# Altium footprint library 15-LEDs+LCD.PcbLib: 116 footprints (part 1 of 8)
Each footprint in its own frame and in the unit in brackets; x right, y up, seen from the top. Pads: shape width x height; smd on the part's side, far side on the other; paste and mask are expansions set on the pad; w line width, h text height; cw(c..) or ccw(c..) is an arc to the next point about the centre after c.
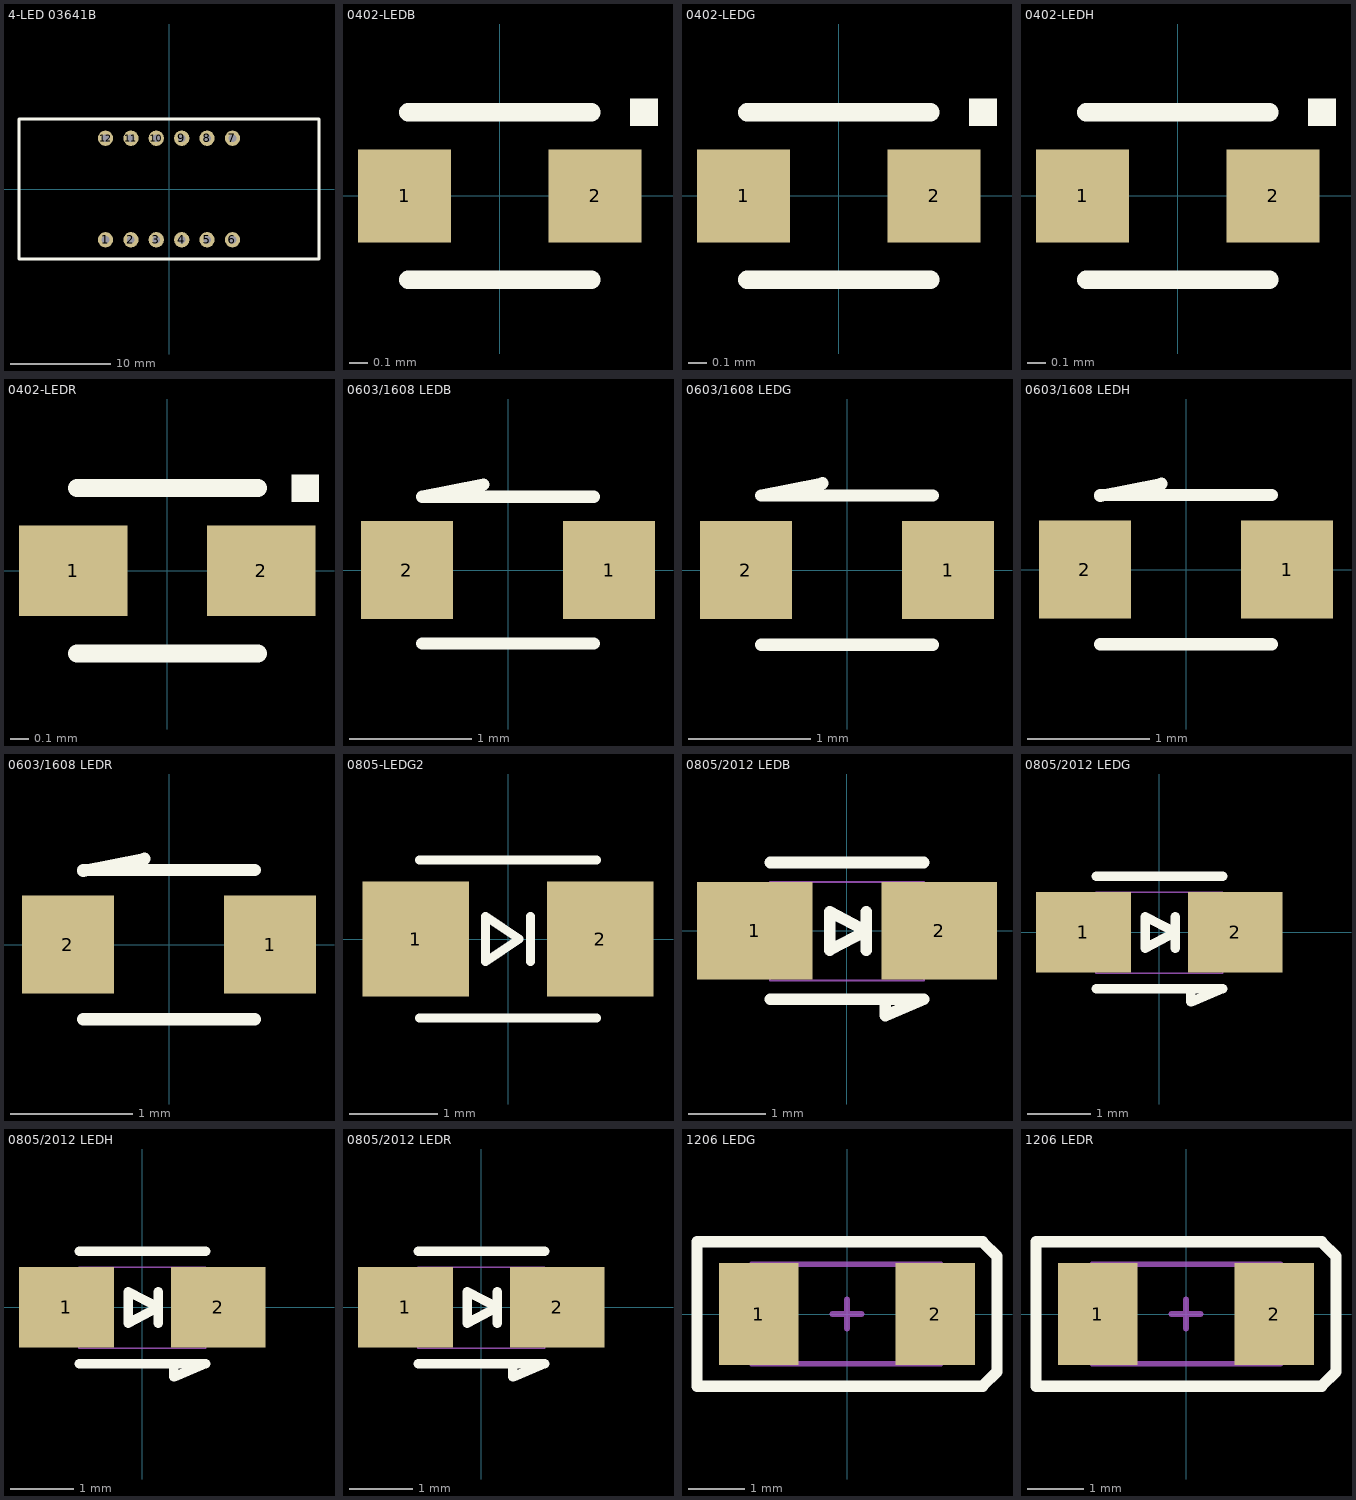
[diagram p0: the footprints below, top view; thin cyan lines are the x and y axes]

## 4-LED 03641B [mil] "CON A"
height 122.05
pads (12):
  round 60 hole 30: 1(-250,-200) 2(-150,-200) 3(-50,-200) 4(50,-200) 5(150,-200) 6(250,-200) 7(250,200) 8(150,200) 9(50,200) 10(-50,200) 11(-150,200) 12(-250,200)
Top Overlay:
  lines w10: -590.55,-275.59 590.55,-275.59 590.55,275.59 -590.55,275.59 -590.55,-275.59
Mechanical 15:
  lines w5: -589,-276 -589,276 590,276 590,-276 -589,-276
3D body "03641b.stp": height 284.25, standoff -118.11, extent -590.56,-275.6 590.54,275.58

## 0402-LEDB [mil]
height 122.05
pads (2):
  rect 20x20 smd mask+2.76: 1(-20.5,0)
  rect 20x20 smd: 2(20.5,0)
Top Overlay:
  rectangle: 28,15 34,21
  lines w3.94: -19.68,-18 19.68,-18 ; -19.68,18 19.68,18
Bottom Overlay:
3D body "0_508-0_508-0402-3.stp": height 0.79, standoff 0, extent -30.5,-10 -10.5,10
3D body "0_508-0_508-0402-3.stp": height 0.79, standoff 0, extent 10.5,-10.01 30.5,9.99
3D body "led_0402g.stp": height 15.55, standoff 0, extent -19.68,-9.84 19.68,9.84

## 0402-LEDG [mil]
height 122.05
pads (2):
  rect 20x20 smd mask+2.76: 1(-20.5,0)
  rect 20x20 smd: 2(20.5,0)
Top Overlay:
  rectangle: 28,15 34,21
  lines w3.94: -19.68,-18 19.68,-18 ; -19.68,18 19.68,18
Bottom Overlay:
3D body "led_0402b.stp": height 15.55, standoff 0, extent -19.68,-9.84 19.69,9.85
3D body "0_508-0_508-0402-3.stp": height 0.79, standoff 0, extent 10.5,-10.01 30.5,9.99
3D body "0_508-0_508-0402-3.stp": height 0.79, standoff 0, extent -30.5,-10 -10.5,10

## 0402-LEDH [mil]
height 122.05
pads (2):
  rect 20x20 smd mask+2.76: 1(-20.5,0)
  rect 20x20 smd: 2(20.5,0)
Top Overlay:
  rectangle: 28,15 34,21
  lines w3.94: -19.68,-18 19.68,-18 ; -19.68,18 19.68,18
Bottom Overlay:
3D body "led_0402h.stp": height 15.55, standoff 0, extent -19.68,-9.84 19.68,9.84
3D body "0_508-0_508-0402-3.stp": height 0.79, standoff 0, extent -30.5,-10 -10.5,10
3D body "0_508-0_508-0402-3.stp": height 0.79, standoff 0, extent 10.5,-10.01 30.5,9.99

## 0402-LEDR [mm]
height 3.1
pads (2):
  rect 0.6x0.5 smd: 1(-0.52,0)
  rect 0.6x0.5 smd mask+0.07: 2(0.52,0)
Top Overlay:
  rectangle: 0.686,0.381 0.838,0.533
  lines w0.1: -0.5,-0.457 0.5,-0.457 ; -0.5,0.457 0.5,0.457
Bottom Overlay:
3D body "0_508-0_508-0402-3.stp": height 0.02, standoff 0, extent -0.813,-0.254 -0.305,0.254
3D body "0_508-0_508-0402-3.stp": height 0.02, standoff 0, extent 0.305,-0.254 0.813,0.254
3D body "led_0402r.stp": height 0.4, standoff 0, extent -0.5,-0.25 0.5,0.25

## 0603/1608 LEDB [mm]
height 3.1
pads (2):
  rect 0.75x0.8 smd: 1(0.826,0) 2(-0.826,0)
Top Overlay:
  lines w0.1: -0.7,-0.6 0.7,-0.6 ; -0.2,0.7 -0.7,0.6 0.7,0.6
3D body "0603-ledb.stp": height 0.35, standoff 0, extent -0.8,-0.4 0.8,0.4
3D body "0_8128-0_762-0603.stp": height 0.02, standoff 0, extent -1.206,-0.406 -0.445,0.406
3D body "0_8128-0_762-0603.stp": height 0.02, standoff 0, extent 0.445,-0.406 1.206,0.406

## 0603/1608 LEDG [mm] "Kingbright,1608,LED,400 mcd 120*"
height 3.1
pads (2):
  rect 0.75x0.8 smd: 1(0.826,0) 2(-0.826,0)
Top Overlay:
  lines w0.1: -0.7,-0.61 0.7,-0.61 ; -0.2,0.71 -0.7,0.61 0.7,0.61
3D body "0603-ledg.stp": height 0.35, standoff 0, extent -0.8,-0.4 0.8,0.4
3D body "0_8128-0_762-0603.stp": height 0.02, standoff 0, extent -1.206,-0.406 -0.445,0.406
3D body "0_8128-0_762-0603.stp": height 0.02, standoff 0, extent 0.445,-0.406 1.206,0.406

## 0603/1608 LEDH [mm]
height 3.1
pads (2):
  rect 0.75x0.8 smd: 1(0.826,0) 2(-0.826,0)
Top Overlay:
  lines w0.1: -0.7,-0.61 0.7,-0.61 ; -0.7,0.6 -0.2,0.7 ; -0.7,0.61 0.7,0.61
3D body "0_8128-0_762-0603.stp": height 0.02, standoff 0, extent 0.445,-0.406 1.206,0.406
3D body "0_8128-0_762-0603.stp": height 0.02, standoff 0, extent -1.206,-0.406 -0.445,0.406
3D body "0603-led-y.stp": height 0.79, standoff 0, extent -0.8,-0.4 0.8,0.4

## 0603/1608 LEDR [mm]
height 3.1
pads (2):
  rect 0.75x0.8 smd: 1(0.826,0) 2(-0.826,0)
Top Overlay:
  lines w0.1: -0.7,-0.61 0.7,-0.61 ; -0.7,0.6 -0.2,0.7 ; -0.7,0.61 0.7,0.61
3D body "0603-led-r.stp": height 0.79, standoff 0, extent -0.8,-0.4 0.8,0.4
3D body "0_8128-0_762-0603.stp": height 0.02, standoff 0, extent -1.206,-0.406 -0.445,0.406
3D body "0_8128-0_762-0603.stp": height 0.02, standoff 0, extent 0.445,-0.406 1.206,0.406

## 0805-LEDG2 [mm]
height 3.1
pads (2):
  rect 1.2x1.3 smd: 1(-1.041,0) 2(1.041,0)
Top Overlay:
  lines w0.1: 0.254,-0.254 0.254,0.254 ; -0.254,-0.254 -0.254,0.254 0.127,0 -0.254,-0.254
  lines w0.102: -1,-0.889 1,-0.889 ; -1,0.889 1,0.889
3D body "1206-led-g.stp": height 1.39, standoff 0, extent -1.6,-0.808 1.6,0.808

## 0805/2012 LEDB [mm]
height 3.1
pads (2):
  rect 1.5x1.27 smd: 1(-1.2,0)
  rect 1.5x1.27 smd mask+0.07: 2(1.2,0)
Top Overlay:
  lines w0.15: -1,-0.889 1,-0.889 ; -1,0.889 1,0.889 ; 0.25,-0.25 0.25,0.25 ; 0.5,-1.1 1,-0.889 ; 0.5,-0.889 1,-0.889 ; 0.5,-0.889 0.5,-1.097 0.5,-0.889 ; -0.225,-0.25 -0.225,0.25 0.25,0 -0.225,-0.25
Mechanical 15:
  lines w0.025: -1.003,-0.648 1.003,-0.648 1.003,0.635 -1.003,0.635 -1.003,-0.648
3D body "0805B.stp": height 1.09, standoff 0, extent -1,-0.625 1,0.625
3D body "0805_1016_127.stp": height 0.01, standoff 0, extent 0.892,-0.635 1.908,0.635
3D body "0805_1016_127.stp": height 0.01, standoff 0, extent -1.908,-0.635 -0.892,0.635

## 0805/2012 LEDG [mm]
height 3.1
pads (2):
  rect 1.5x1.27 smd: 1(-1.2,0)
  rect 1.5x1.27 smd mask+0.07: 2(1.2,0)
Top Overlay:
  lines w0.15: -1,-0.889 1,-0.889 ; -1,0.889 1,0.889 ; 0.25,-0.25 0.25,0.25 ; 0.5,-1.1 1,-0.889 ; 0.5,-0.889 1,-0.889 ; 0.5,-0.889 0.5,-1.097 0.5,-0.889 ; -0.225,-0.25 -0.225,0.25 0.25,0 -0.225,-0.25
Mechanical 15:
  lines w0.025: -1.003,-0.648 1.003,-0.648 1.003,0.635 -1.003,0.635 -1.003,-0.648
3D body "0805_1016_127.stp": height 0.01, standoff 0, extent -1.908,-0.635 -0.892,0.635
3D body "0805_1016_127.stp": height 0.01, standoff 0, extent 0.9,-0.635 1.916,0.635
3D body "0805G.stp": height 1.09, standoff 0, extent -1,-0.625 1,0.625

## 0805/2012 LEDH [mm]
height 3.1
pads (2):
  rect 1.5x1.27 smd: 1(-1.2,0)
  rect 1.5x1.27 smd mask+0.07: 2(1.2,0)
Top Overlay:
  lines w0.15: -1,-0.889 1,-0.889 ; -1,0.889 1,0.889 ; 0.25,-0.25 0.25,0.25 ; 0.5,-1.1 1,-0.889 ; 0.5,-0.889 0.5,-1.097 0.5,-0.889 ; 0.5,-0.889 1,-0.889 ; -0.225,-0.25 0.25,0 -0.225,0.25 -0.225,-0.25
Mechanical 15:
  lines w0.025: -1.003,-0.648 -1.003,0.635 1.003,0.635 1.003,-0.648 -1.003,-0.648
3D body "0805h.stp": height 1.09, standoff 0, extent -1,-0.625 1,0.625
3D body "0805_1016_127.stp": height 0.01, standoff 0, extent -1.908,-0.635 -0.892,0.635
3D body "0805_1016_127.stp": height 0.01, standoff 0, extent 0.892,-0.635 1.908,0.635

## 0805/2012 LEDR [mm]
height 3.1
pads (2):
  rect 1.5x1.27 smd: 1(-1.2,0)
  rect 1.5x1.27 smd mask+0.07: 2(1.2,0)
Top Overlay:
  lines w0.15: -1,-0.889 1,-0.889 ; -1,0.889 1,0.889 ; 0.25,-0.25 0.25,0.25 ; 0.5,-1.1 1,-0.889 ; 0.5,-0.889 1,-0.889 ; 0.5,-0.889 0.5,-1.097 0.5,-0.889 ; -0.225,-0.25 -0.225,0.25 0.25,0 -0.225,-0.25
Mechanical 15:
  lines w0.025: -1.003,-0.648 1.003,-0.648 1.003,0.635 -1.003,0.635 -1.003,-0.648
3D body "0805_1016_127.stp": height 0.01, standoff 0, extent -1.908,-0.635 -0.892,0.635
3D body "0805_1016_127.stp": height 0.01, standoff 0, extent 0.892,-0.635 1.908,0.635
3D body "0805R.stp": height 1.09, standoff 0, extent -1,-0.625 1,0.625

## 1206 LEDG [mm]
height 3.1
pads (2):
  rect 1.4x1.8 smd: 1(-1.55,0)
  rect 1.4x1.8 smd mask+0.07: 2(1.55,0)
Top Overlay:
  lines w0.2: -2.642,-1.27 -2.642,1.27 2.388,1.27 2.642,1.016 2.642,-1.016 2.388,-1.27 -2.642,-1.27
Mechanical 15:
  lines w0.1: -0.254,0 0.254,0 ; 0,-0.254 0,0.254 ; -1.676,-0.876 -1.676,0.876 1.651,0.876 1.651,-0.876 -1.676,-0.876
3D body "1_64-1_4.stp": height 0.02, standoff 0, extent -2.249,-0.82 -0.849,0.82
3D body "1_64-1_4.stp": height 0.02, standoff 0, extent 0.848,-0.82 2.248,0.82
3D body "1206-led-g.stp": height 1.39, standoff 0, extent -1.6,-0.808 1.6,0.808

## 1206 LEDR [mm]
height 3.1
pads (2):
  rect 1.4x1.8 smd mask+0.07: 1(-1.55,0)
  rect 1.4x1.8 smd: 2(1.55,0)
Top Overlay:
  lines w0.2: -2.642,-1.27 -2.642,1.27 2.388,1.27 2.642,1.016 2.642,-1.016 2.388,-1.27 -2.642,-1.27
Mechanical 15:
  lines w0.1: -0.254,0 0.254,0 ; -1.651,-0.876 1.664,-0.876 1.664,0.876 -1.651,0.876 -1.651,-0.876 ; 0,-0.254 0,0.254 0,-0.254
3D body "1206-led-r.stp": height 1.39, standoff 0, extent -1.6,-0.808 1.6,0.808
3D body "1_64-1_4.stp": height 0.02, standoff 0, extent -2.249,-0.82 -0.849,0.82
3D body "1_64-1_4.stp": height 0.02, standoff 0, extent 0.848,-0.82 2.248,0.82